# Altium footprint library Hydra_Ref_pcb.PcbLib: 353 footprints (part 1 of 23)
Each footprint in its own frame and in the unit in brackets; x right, y up, seen from the top. Pads: shape width x height; smd on the part's side, far side on the other; paste and mask are expansions set on the pad; w line width, h text height; cw(c..) or ccw(c..) is an arc to the next point about the centre after c.
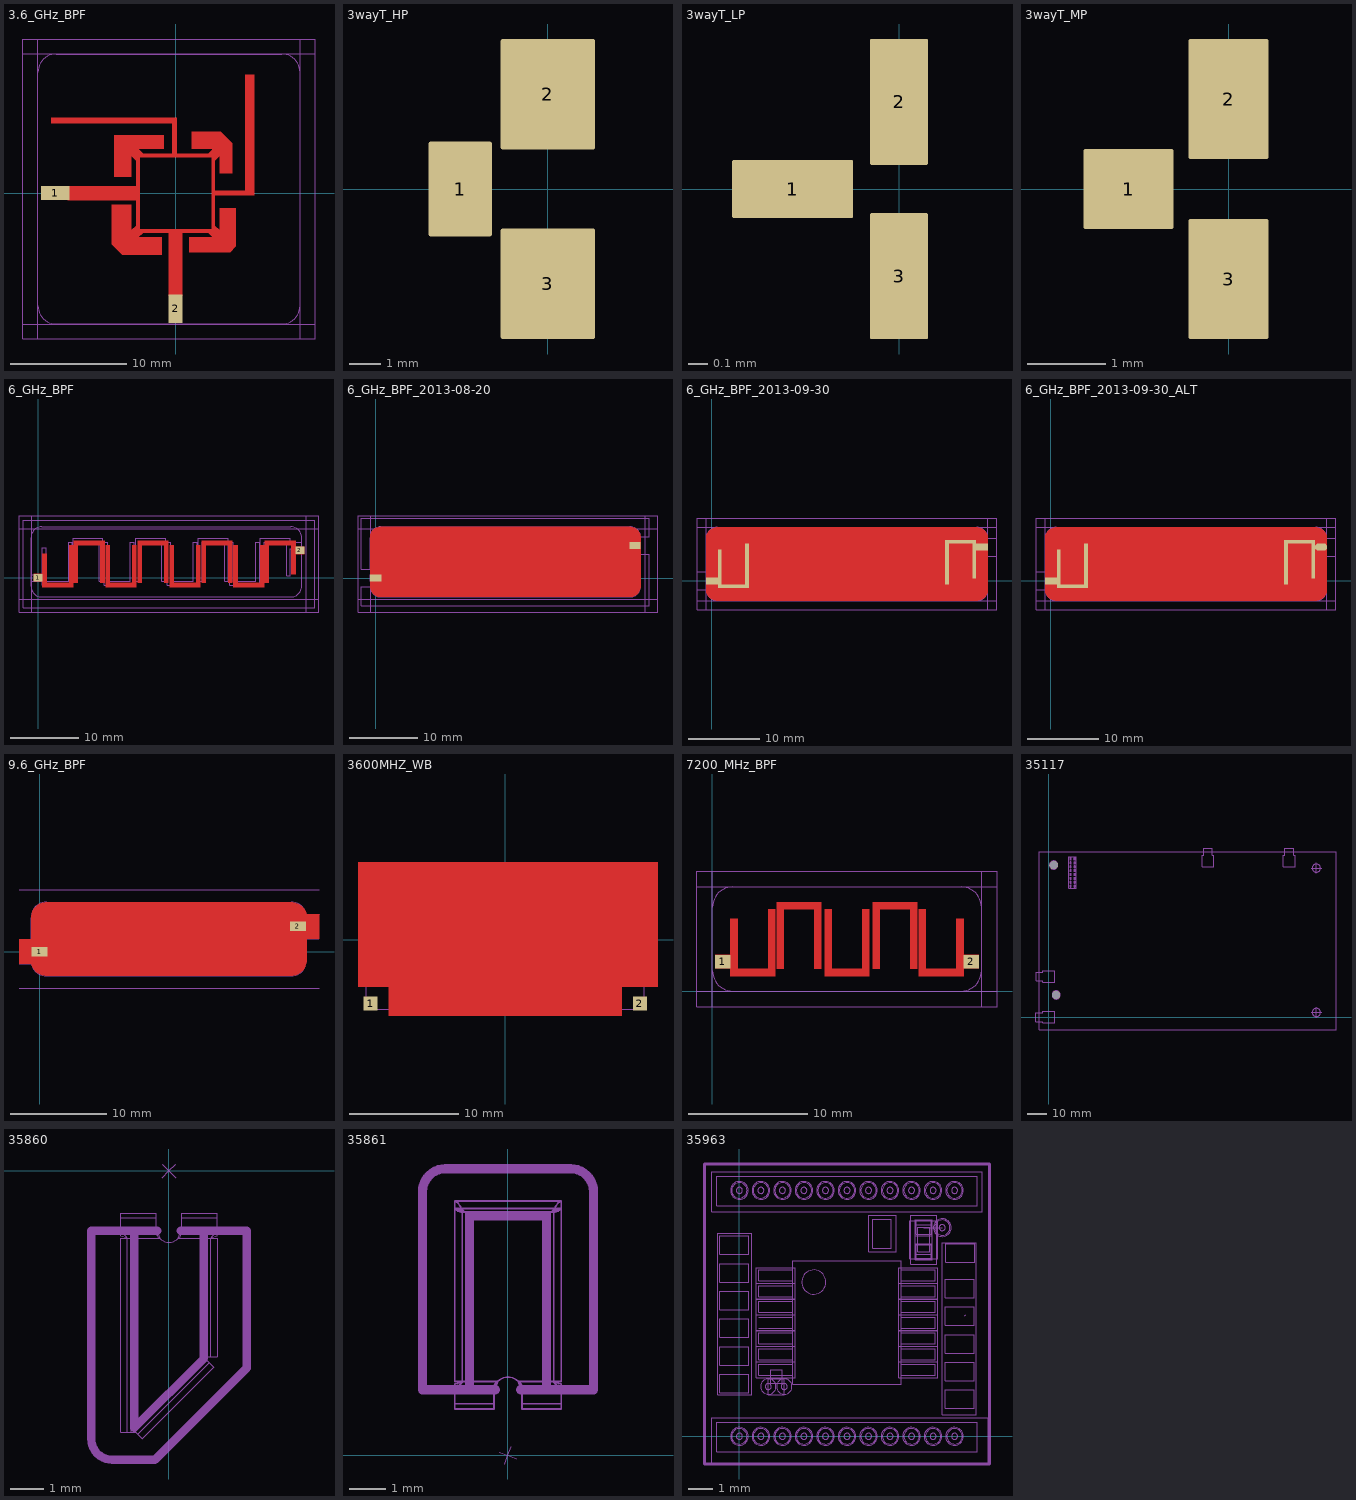
[diagram p0: the footprints below, top view; thin cyan lines are the x and y axes]

## 3.6_GHz_BPF [mm]
height 3.81
pads (2):
  rect 2.47x1.2 smd paste-1.27 mask+0: 1(-10.365,0)
  rect 1.2x2.47 smd paste-1.27 mask+0: 2(0,-9.965)
Top Layer:
  region: -5.5,-4.4 -4.6,-5.3 -1.2,-5.3 -1.2,-3.8 -3.2,-3.8 -2.8,-3.4 -0.6,-3.4 -0.6,-8.865 0.6,-8.865 0.6,-3.4 2.8,-3.4 3.2,-3.8 1.2,-3.8 1.2,-5.1 4.7,-5.1 5.2,-4.6 5.2,-1.3 3.8,-1.3 3.8,-3.2 3.4,-2.8 3.4,-0.2 6.8,-0.2 6.8,10.2 6,10.2 6,0.2 3.4,0.2 3.4,2.8 3.8,3.2 3.8,1.7 4.9,1.7 4.9,4.3 3.9,5.3 1.4,5.3 1.4,3.8 3.2,3.8 3.1,3.7 2.8,3.4 0.465,3.4 0.465,3.1 3.1,3.1 3.1,-3.1 -3.1,-3.1 -3.1,3.1 0.465,3.1 0.465,3.4 0.1,3.4 0.1,6.5 -10.7,6.5 -10.7,6 -0.3,6 -0.3,3.4 -2.8,3.4 -3.2,3.8 -1,3.8 -1,5 -5.3,5 -5.3,1.4 -3.8,1.4 -3.8,3.2 -3.4,2.8 -3.4,0.6 -9.271,0.6 -9.271,-0.6 -3.4,-0.6 -3.4,-2.8 -3.8,-3.2 -3.8,-1 -5.5,-1
Top Solder:
  rectangle: -11.875,-11.303 10.75,12
9 Top Assy:
  lines w0.051: -11.85,-9.703 ccw(c-10.275,-9.703) -10.275,-11.278 9.15,-11.278 ccw(c9.15,-9.703) 10.725,-9.703 10.725,10.4 ccw(c9.15,10.4) 9.15,11.975 -10.275,11.975 ccw(c-10.275,10.4) -11.85,10.4 -11.85,-9.703
13 Top 3D Bodies:
  lines w0.051: -13.145,-11.303 -11.875,-11.303 ; -13.145,12 -11.875,12 ; -11.875,-12.573 -11.875,-11.303 ; -11.875,-11.475 -11.875,12 ; 10.75,-12.573 10.75,-11.303 ; 10.75,13.27 10.75,12 ; 12.02,-11.303 10.75,-11.303 ; 12.02,12 10.75,12 ; -11.875,-11.303 10.75,-11.303 ; -11.875,12 10.75,12 ; -11.875,12 -11.875,13.27 ; -11.875,13.27 -13.145,13.27 -13.145,-12.573 12.02,-12.573 12.02,13.27 -11.875,13.27 ; 10.75,-11.303 10.75,12
Mechanical 30:
  lines w0.051: -13.145,-11.303 -11.875,-11.303 ; -13.145,12 -11.875,12 ; -11.875,-12.573 -11.875,-11.303 ; -11.875,-11.475 -11.875,12 ; 10.75,-12.573 10.75,-11.303 ; 10.75,13.27 10.75,12 ; 12.02,-11.303 10.75,-11.303 ; 12.02,12 10.75,12 ; -11.875,-11.303 10.75,-11.303 ; -11.875,12 10.75,12 ; -11.875,12 -11.875,13.27 ; -11.875,13.27 12.02,13.27 12.02,-12.573 -13.145,-12.573 -13.145,13.27 -11.875,13.27 ; 10.75,-11.303 10.75,12
3D body: height 3.78, standoff 0, extent -11.85,-11.278 10.725,11.975

## 3wayT_HP [mil] "3 way high power power net tie T shape junction"
height 1
pads (3):
  rrect5% 80x120 smd paste-100 mask-100: 1(-111,0)
  rrect5% 120x140 smd paste-100 mask-100: 2(0,120) 3(0,-120)

## 3wayT_LP [mil] "3 way low power net tie T shape junction"
height 1
pads (3):
  rrect5% 25x12 smd paste-100 mask-15: 1(-22,0)
  rrect5% 12x26 smd paste-100 mask-15: 2(0,18) 3(0,-18)

## 3wayT_MP [mil] "3 way medium power net tie T shape junction"
height 1
pads (3):
  rrect5% 45x40 smd paste-100 mask-100: 1(-50,0)
  rrect5% 40x60 smd paste-100 mask-100: 2(0,45) 3(0,-45)

## 6_GHz_BPF [mil]
height 180
pads (2):
  rect 50x44 smd paste-25 mask+10: 1(0,0) 2(1513.25,158)
Top Layer:
  region: 1310.25,-30 1310.25,212 1488.25,212 1488.25,180 1538.25,180 1538.25,136 1488.25,136 1488.25,21 1464.25,21 1464.25,188 1334.25,188 1334.25,-30
  region: 1129.25,-54 1129.25,188 1153.25,188 1153.25,-30 1283.25,-30 1283.25,188 1307.25,188 1307.25,-54
  region: 944.75,-30 944.75,212 1122.75,212 1122.75,-30 1098.75,-30 1098.75,188 968.75,188 968.75,-30
  region: 760,-54 760,188 784,188 784,-30 914,-30 914,188 938,188 938,-54
  region: 575.25,-30 575.25,212 753.25,212 753.25,-30 729.25,-30 729.25,188 599.25,188 599.25,-30
  region: 390.5,-54 390.5,188 414.5,188 414.5,-30 544.5,-30 544.5,188 568.5,188 568.5,-54
  region: 206,-30 206,212 384,212 384,-30 360,-30 360,188 230,188 230,-30
  region: -25,-22 -25,22 25,22 25,137 49,137 49,-30 179,-30 179,188 203,188 203,-54 25,-54 25,-22
Top Solder:
  rectangle: -35,-124 1548.25,282
7 DXF/DWG Import:
  lines w2: -40.25,-22 25,-22 25,-43.5 198,-43.5 198,205 176.5,205 176.5,-22 46.5,-22 46.5,172.5 25,172.5 25,17 -40.25,17 ; -40.25,-49 ccw(c22.25,-49) 22.25,-111.5 1460.5,-111.5 ccw(c1460.5,-49) 1523,-49 1523,232 ccw(c1460.5,232) 1460.5,294.5 22.25,294.5 ccw(c22.25,232) -40.25,232 -40.25,-49 ; 202,-22 223.5,-22 223.5,205 353.5,205 353.5,-22 375,-22 375,226.5 202,226.5 202,-22 ; 382.5,-43.5 382.5,205 404,205 404,-22 534,-22 534,205 555.5,205 555.5,-43.5 382.5,-43.5 ; 564,-22 585.5,-22 585.5,205 715.5,205 715.5,-22 737,-22 737,226.5 564,226.5 564,-22 ; 745.5,-43.5 745.5,205 767,205 767,-22 897,-22 897,205 918.5,205 918.5,-43.5 745.5,-43.5 ; 927,-22 948.5,-22 948.5,205 1078.5,205 1078.5,-22 1100,-22 1100,226.5 927,226.5 927,-22 ; 1107.5,-43.5 1107.5,205 1129,205 1129,-22 1259,-22 1259,205 1280.5,205 1280.5,-43.5 1107.5,-43.5 ; 1284.5,-22 1306,-22 1306,205 1436,205 1436,10.5 1457.5,10.5 1457.5,166 1523,166 1523,205 1457.5,205 1457.5,226.5 1284.5,226.5 1284.5,-22
9 Top Assy:
  lines w2: -110,-124 -35,-124 -35,-199 ; -110,282 -35,282 -35,357 ; 1548.25,-199 1548.25,-124 1623.25,-124 ; 1548.25,357 1548.25,282 1623.25,282 ; -35,357 -110,357 -110,-199 1623.25,-199 1623.25,357 -35,357
  lines w3: -35,-124 1548.25,-124 1548.25,282 -35,282 -35,-124
  text ".Designator" at 631,54 h50
13 Top 3D Bodies:
  lines w2: -85,-124 -35,-124 -35,-174 ; -85,282 -35,282 -35,332 ; 1548.25,-174 1548.25,-124 1598.25,-124 ; 1548.25,332 1548.25,282 1598.25,282 ; -35,332 1598.25,332 1598.25,-174 -85,-174 -85,332 -35,332
  lines w3: -35,-124 -35,282 1548.25,282 1548.25,-124 -35,-124
3D body: height 180, standoff 0, extent -85,-174 1598.25,332

## 6_GHz_BPF_2013-08-20 [mil]
height 180
pads (2):
  rect 65.25x39 smd paste-25 mask+10: 1(0,0)
  rect 65.5x39 smd paste-25 mask+10: 2(1497.88,188)
Top Layer:
  region: 1292.12,-19.5 1292.12,229 1465.12,229 1465.12,207.5 1530.62,207.5 1530.62,168.5 1465.12,168.5 1465.12,13 1443.62,13 1443.62,207.5 1313.62,207.5 1313.62,-19.5
  region: 1115.12,-41 1115.12,207.5 1136.62,207.5 1136.62,-19.5 1266.62,-19.5 1266.62,207.5 1288.12,207.5 1288.12,-41
  region: 934.62,-19.5 934.62,229 1107.62,229 1107.62,-19.5 1086.12,-19.5 1086.12,207.5 956.12,207.5 956.12,-19.5
  region: 753.12,-41 753.12,207.5 774.62,207.5 774.62,-19.5 904.62,-19.5 904.62,207.5 926.12,207.5 926.12,-41
  region: 571.62,-19.5 571.62,229 744.62,229 744.62,-19.5 723.12,-19.5 723.12,207.5 593.12,207.5 593.12,-19.5
  region: 390.12,-41 390.12,207.5 411.62,207.5 411.62,-19.5 541.62,-19.5 541.62,207.5 563.12,207.5 563.12,-41
  region: 209.62,-19.5 209.62,229 382.62,229 382.62,-19.5 361.12,-19.5 361.12,207.5 231.12,207.5 231.12,-19.5
  region: -32.62,-19.5 -32.62,19.5 32.62,19.5 32.62,175 54.12,175 54.12,-19.5 184.12,-19.5 184.12,207.5 205.62,207.5 205.62,-41 32.62,-41 32.62,-19.5
  pour cut-out: -32.62,234.5 -32.62,240.66 -30.22,252.73 -25.51,264.1 -18.67,274.34 -9.97,283.05 0.27,289.89 11.64,294.6 23.72,297 29.88,297 1468.12,297 1474.28,297 1486.36,294.6 1497.73,289.89 1507.97,283.05 1516.67,274.34 1523.51,264.1 1528.22,252.73 1530.62,240.66 1530.62,234.5 1530.62,-46.5 1530.62,-52.66 1528.22,-64.73 1523.51,-76.1 1516.67,-86.34 1507.97,-95.05 1497.73,-101.89 1486.36,-106.6 1474.28,-109 1468.12,-109 29.87,-109 23.94,-109 12.29,-106.77 1.26,-102.38 -8.74,-96 -17.36,-87.85 -24.3,-78.23 -29.3,-67.47 -32.19,-55.96 -32.52,-50.04 -32.55,-49.59 -32.59,-48.71 -32.61,-47.83 -32.62,-46.94 -32.62,-46.5
Top Solder:
  region: -32.62,234.5 -32.62,240.66 -30.22,252.73 -25.51,264.1 -18.67,274.34 -9.97,283.05 0.27,289.89 11.64,294.6 23.72,297 29.88,297 1468.12,297 1474.28,297 1486.36,294.6 1497.73,289.89 1507.97,283.05 1516.67,274.34 1523.51,264.1 1528.22,252.73 1530.62,240.66 1530.62,234.5 1530.62,-46.5 1530.62,-52.66 1528.22,-64.73 1523.51,-76.1 1516.67,-86.34 1507.97,-95.05 1497.73,-101.89 1486.36,-106.6 1474.28,-109 1468.12,-109 29.87,-109 23.94,-109 12.29,-106.77 1.26,-102.38 -8.74,-96 -17.36,-87.85 -24.3,-78.23 -29.3,-67.47 -32.19,-55.96 -32.52,-50.04 -32.55,-49.59 -32.59,-48.71 -32.61,-47.83 -32.62,-46.94 -32.62,-46.5
9 Top Assy:
  lines w2: -102.38,-121.5 -27.38,-121.5 -27.38,-196.5 ; -102.38,284.5 -27.38,284.5 -27.38,359.5 ; 1555.88,-196.5 1555.88,-121.5 1630.88,-121.5 ; 1555.88,359.5 1555.88,284.5 1630.88,284.5 ; -27.38,359.5 -102.38,359.5 -102.38,-196.5 1630.88,-196.5 1630.88,359.5 -27.38,359.5
  lines w3: -27.38,-121.5 1555.88,-121.5 1555.88,284.5 -27.38,284.5 -27.38,-121.5
  text ".Designator" at 562,64 h50
Mechanical 30:
  lines w2: -32.53,-50 -82.62,-50 -82.62,-159 1580.62,-159 ; -32.52,-50.04 ccw(c29.88,-46.5) 29.87,-109 ; 29.88,-109 1468.12,-109 ccw(c1468.12,-46.5) 1530.62,-46.5 1530.62,137.96 ; 1530.63,138 1580.62,138 1580.62,-158.75 ; -82.62,50 -82.62,347 1580.62,347 1580.62,238 1530.53,238 ccw(c1468.12,234.5) 1468.12,297 29.88,297 ccw(c29.88,234.5) -32.62,234.5 -32.62,50 -82.62,50 ; -32.62,-19.5 -32.62,19.5 32.62,19.5 32.62,175 54.12,175 54.12,-19.5 184.12,-19.5 184.12,207.5 205.62,207.5 205.62,-41 32.62,-41 32.62,-19.5 -32.62,-19.5 ; 209.62,-19.5 231.12,-19.5 231.12,207.5 361.12,207.5 361.12,-19.5 382.62,-19.5 382.62,229 209.62,229 209.62,-19.5 ; 390.12,-41 390.12,207.5 411.62,207.5 411.62,-19.5 541.62,-19.5 541.62,207.5 563.12,207.5 563.12,-41 390.12,-41 ; 571.62,-19.5 593.12,-19.5 593.12,207.5 723.12,207.5 723.12,-19.5 744.62,-19.5 744.62,229 571.62,229 571.62,-19.5 ; 753.12,-41 753.12,207.5 774.62,207.5 774.62,-19.5 904.62,-19.5 904.62,207.5 926.12,207.5 926.12,-41 753.12,-41 ; 934.62,-19.5 956.12,-19.5 956.12,207.5 1086.12,207.5 1086.12,-19.5 1107.62,-19.5 1107.62,229 934.62,229 934.62,-19.5 ; 1115.12,-41 1115.12,207.5 1136.62,207.5 1136.62,-19.5 1266.62,-19.5 1266.62,207.5 1288.12,207.5 1288.12,-41 1115.12,-41 ; 1292.12,-19.5 1313.62,-19.5 1313.62,207.5 1443.62,207.5 1443.62,13 1465.12,13 1465.12,168.5 1530.62,168.5 1530.62,207.5 1465.12,207.5 1465.12,229 1292.12,229 1292.12,-19.5
3D body: height 180, standoff 0, extent -82.62,-159 1580.62,347

## 6_GHz_BPF_2013-09-30 [mil]
height 180
pads (8):
  rect 65.25x39 smd paste-25 mask+10: 1(0,0.7)
  rect 21.5x213.5 smd paste-25 mask+10: 1(43.38,66.45) 2(1454.38,120.95)
  rect 130x21.5 smd paste-25 mask+10: 1(119.12,-29.55) 2(1378.62,216.95)
  rect 21.5x246.5 smd paste-25 mask+10: 1(194.88,82.95) 2(1302.88,104.45)
  rect 65.5x39 smd paste-25 mask+10: 2(1497.88,186.7)
Top Layer:
  region: 209.62,-18.8 209.62,227.7 382.62,227.7 382.62,-18.8 361.12,-18.8 361.12,206.2 231.12,206.2 231.12,-18.8
  region: 390.12,-40.3 390.12,206.2 411.62,206.2 411.62,-18.8 541.62,-18.8 541.62,206.2 563.12,206.2 563.12,-40.3
  region: 571.62,-18.8 571.62,227.7 744.62,227.7 744.62,-18.8 723.12,-18.8 723.12,206.2 593.12,206.2 593.12,-18.8
  region: 753.12,-40.3 753.12,206.2 774.62,206.2 774.62,-18.8 904.62,-18.8 904.62,206.2 926.12,206.2 926.12,-40.3
  region: 934.62,-18.8 934.62,227.7 1107.62,227.7 1107.62,-18.8 1086.12,-18.8 1086.12,206.2 956.12,206.2 956.12,-18.8
  region: 1115.12,-40.3 1115.12,206.2 1136.62,206.2 1136.62,-18.8 1266.62,-18.8 1266.62,206.2 1288.12,206.2 1288.12,-40.3
  pour cut-out: -32.62,-46.8 -32.62,234.2 -32.62,240.35 -30.22,252.43 -25.51,263.8 -18.67,274.04 -9.97,282.74 0.27,289.58 11.64,294.3 23.72,296.7 29.88,296.7 1468.12,296.7 1474.28,296.7 1486.36,294.3 1497.73,289.58 1507.97,282.74 1516.67,274.04 1523.51,263.8 1528.22,252.43 1530.62,240.35 1530.62,234.2 1530.62,-46.8 1530.62,-52.96 1528.22,-65.03 1523.51,-76.41 1516.67,-86.64 1507.97,-95.35 1497.73,-102.19 1486.36,-106.9 1474.28,-109.3 1468.12,-109.3 29.87,-109.3 23.72,-109.3 11.64,-106.9 0.27,-102.19 -9.97,-95.35 -18.67,-86.64 -25.51,-76.41 -30.22,-65.03 -32.62,-52.96
Top Solder:
  region: -32.62,-46.8 -32.62,234.2 -32.62,240.35 -30.22,252.43 -25.51,263.8 -18.67,274.04 -9.97,282.74 0.27,289.58 11.64,294.3 23.72,296.7 29.88,296.7 1468.12,296.7 1474.28,296.7 1486.36,294.3 1497.73,289.58 1507.97,282.74 1516.67,274.04 1523.51,263.8 1528.22,252.43 1530.62,240.35 1530.62,234.2 1530.62,-46.8 1530.62,-52.96 1528.22,-65.03 1523.51,-76.41 1516.67,-86.64 1507.97,-95.35 1497.73,-102.19 1486.36,-106.9 1474.28,-109.3 1468.12,-109.3 29.87,-109.3 23.72,-109.3 11.64,-106.9 0.27,-102.19 -9.97,-95.35 -18.67,-86.64 -25.51,-76.41 -30.22,-65.03 -32.62,-52.96
9 Top Assy:
  lines w2: 32.37,-108.3 cw(c32.38,-44.3) -31.62,-44.3 -31.62,231.7 cw(c32.38,231.7) 32.38,295.7 1465.58,295.7 cw(c1465.58,231.7) 1529.58,231.7 1529.58,-44.3 cw(c1465.58,-44.3) 1465.58,-108.3 32.38,-108.3
Mechanical 30:
  lines w2: -82.62,-109.3 1580.5,-109.3 ; -82.62,-49.3 -32.58,-49.3 ; -82.62,50.7 -32.62,50.7 -32.62,234.2 cw(c29.88,234.2) 29.88,296.7 1468.12,296.7 cw(c1468.12,234.2) 1530.57,236.7 ; -82.62,296.7 1580.62,296.7 ; -32.62,-159.3 -32.62,346.7 ; -32.57,-49.3 ccw(c29.88,-46.8) 29.87,-109.3 ; 29.88,-109.3 1468.12,-109.3 ccw(c1468.12,-46.8) 1530.62,-46.8 1530.62,136.7 1580.62,136.7 ; 1530.58,-159.3 1530.58,346.7 ; 1530.58,236.7 1580.62,236.7 ; 1580.5,-159.3 -82.62,-159.3 -82.62,346.7 1580.62,346.7 1580.62,-159.3 ; -32.62,-18.8 32.62,-18.8 32.62,-40.3 205.62,-40.3 205.62,206.2 184.12,206.2 184.12,-18.8 54.12,-18.8 54.12,173.2 32.62,173.2 32.62,20.2 -32.62,20.2 -32.62,-18.8 ; 209.62,-18.8 231.12,-18.8 231.12,206.2 361.12,206.2 361.12,-18.8 382.62,-18.8 382.62,227.7 209.62,227.7 209.62,-18.8 ; 390.12,-40.3 390.12,206.2 411.62,206.2 411.62,-18.8 541.62,-18.8 541.62,206.2 563.12,206.2 563.12,-40.3 390.12,-40.3 ; 571.62,-18.8 593.12,-18.8 593.12,206.2 723.12,206.2 723.12,-18.8 744.62,-18.8 744.62,227.7 571.62,227.7 571.62,-18.8 ; 753.12,-40.3 753.12,206.2 774.62,206.2 774.62,-18.8 904.62,-18.8 904.62,206.2 926.12,206.2 926.12,-40.3 753.12,-40.3 ; 934.62,-18.8 956.12,-18.8 956.12,206.2 1086.12,206.2 1086.12,-18.8 1107.62,-18.8 1107.62,227.7 934.62,227.7 934.62,-18.8 ; 1115.12,-40.3 1115.12,206.2 1136.62,206.2 1136.62,-18.8 1266.62,-18.8 1266.62,206.2 1288.12,206.2 1288.12,-40.3 1115.12,-40.3 ; 1292.12,-18.8 1313.62,-18.8 1313.62,206.2 1443.62,206.2 1443.62,14.2 1465.12,14.2 1465.12,167.2 1530.62,167.2 1530.62,206.2 1465.12,206.2 1465.12,227.7 1292.12,227.7 1292.12,-18.8
3D body: height 149, standoff 0, extent -31.62,-108.3 1529.58,295.7

## 6_GHz_BPF_2013-09-30_ALT [mil]
height 180
pads (8):
  rect 65.25x39 smd paste-25 mask+10: 1(0,0.7)
  rect 21.5x213.5 smd paste-25 mask+10: 1(43.38,66.45) 2(1454.38,120.95)
  rect 130x21.5 smd paste-25 mask+10: 1(119.12,-29.55) 2(1378.62,216.95)
  rect 21.5x246.5 smd paste-25 mask+10: 1(194.88,82.95) 2(1302.88,104.45)
  oct 65.5x39 smd paste-25 mask+10: 2(1497.88,186.7)
Top Layer:
  rectangle: 1453.5,167.2 1478.4,206.2
  pour cut-out: -32.62,-46.8 -32.62,234.2 -32.62,240.35 -30.22,252.43 -25.51,263.8 -18.67,274.04 -9.97,282.74 0.27,289.58 11.64,294.3 23.72,296.7 29.88,296.7 1468.12,296.7 1474.28,296.7 1486.36,294.3 1497.73,289.58 1507.97,282.74 1516.67,274.04 1523.51,263.8 1528.22,252.43 1530.62,240.35 1530.62,234.2 1530.62,-46.8 1530.62,-52.96 1528.22,-65.03 1523.51,-76.41 1516.67,-86.64 1507.97,-95.35 1497.73,-102.19 1486.36,-106.9 1474.28,-109.3 1468.12,-109.3 29.87,-109.3 23.72,-109.3 11.64,-106.9 0.27,-102.19 -9.97,-95.35 -18.67,-86.64 -25.51,-76.41 -30.22,-65.03 -32.62,-52.96
  region: 1115.12,-40.3 1115.12,206.2 1136.62,206.2 1136.62,-18.8 1266.62,-18.8 1266.62,206.2 1288.12,206.2 1288.12,-40.3
  region: 934.62,-18.8 934.62,227.7 1107.62,227.7 1107.62,-18.8 1086.12,-18.8 1086.12,206.2 956.12,206.2 956.12,-18.8
  region: 753.12,-40.3 753.12,206.2 774.62,206.2 774.62,-18.8 904.62,-18.8 904.62,206.2 926.12,206.2 926.12,-40.3
  region: 571.62,-18.8 571.62,227.7 744.62,227.7 744.62,-18.8 723.12,-18.8 723.12,206.2 593.12,206.2 593.12,-18.8
  region: 390.12,-40.3 390.12,206.2 411.62,206.2 411.62,-18.8 541.62,-18.8 541.62,206.2 563.12,206.2 563.12,-40.3
  region: 209.62,-18.8 209.62,227.7 382.62,227.7 382.62,-18.8 361.12,-18.8 361.12,206.2 231.12,206.2 231.12,-18.8
Top Solder:
  region: -32.62,-46.8 -32.62,234.2 -32.62,240.35 -30.22,252.43 -25.51,263.8 -18.67,274.04 -9.97,282.74 0.27,289.58 11.64,294.3 23.72,296.7 29.88,296.7 1468.12,296.7 1474.28,296.7 1486.36,294.3 1497.73,289.58 1507.97,282.74 1516.67,274.04 1523.51,263.8 1528.22,252.43 1530.62,240.35 1530.62,234.2 1530.62,-46.8 1530.62,-52.96 1528.22,-65.03 1523.51,-76.41 1516.67,-86.64 1507.97,-95.35 1497.73,-102.19 1486.36,-106.9 1474.28,-109.3 1468.12,-109.3 29.87,-109.3 23.72,-109.3 11.64,-106.9 0.27,-102.19 -9.97,-95.35 -18.67,-86.64 -25.51,-76.41 -30.22,-65.03 -32.62,-52.96
9 Top Assy:
  lines w2: 32.37,-108.3 cw(c32.38,-44.3) -31.62,-44.3 -31.62,231.7 cw(c32.38,231.7) 32.38,295.7 1465.58,295.7 cw(c1465.58,231.7) 1529.58,231.7 1529.58,-44.3 cw(c1465.58,-44.3) 1465.58,-108.3 32.38,-108.3
Mechanical 30:
  lines w2: -82.62,-109.3 1580.5,-109.3 ; -82.62,-49.3 -32.58,-49.3 ; -82.62,50.7 -32.62,50.7 -32.62,234.2 cw(c29.88,234.2) 29.88,296.7 1468.12,296.7 cw(c1468.12,234.2) 1530.57,236.7 ; -82.62,296.7 1580.62,296.7 ; -32.62,-159.3 -32.62,346.7 ; -32.57,-49.3 ccw(c29.88,-46.8) 29.87,-109.3 ; 29.88,-109.3 1468.12,-109.3 ccw(c1468.12,-46.8) 1530.62,-46.8 1530.62,136.7 1580.62,136.7 ; 1530.58,-159.3 1530.58,346.7 ; 1530.58,236.7 1580.62,236.7 ; 1580.5,-159.3 -82.62,-159.3 -82.62,346.7 1580.62,346.7 1580.62,-159.3 ; -32.62,-18.8 -32.62,20.2 32.62,20.2 32.62,173.2 54.12,173.2 54.12,-18.8 184.12,-18.8 184.12,206.2 205.62,206.2 205.62,-40.3 32.62,-40.3 32.62,-18.8 -32.62,-18.8 ; 209.62,-18.8 209.62,227.7 382.62,227.7 382.62,-18.8 361.12,-18.8 361.12,206.2 231.12,206.2 231.12,-18.8 209.62,-18.8 ; 390.12,-40.3 563.12,-40.3 563.12,206.2 541.62,206.2 541.62,-18.8 411.62,-18.8 411.62,206.2 390.12,206.2 390.12,-40.3 ; 571.62,-18.8 571.62,227.7 744.62,227.7 744.62,-18.8 723.12,-18.8 723.12,206.2 593.12,206.2 593.12,-18.8 571.62,-18.8 ; 753.12,-40.3 926.12,-40.3 926.12,206.2 904.62,206.2 904.62,-18.8 774.62,-18.8 774.62,206.2 753.12,206.2 753.12,-40.3 ; 934.62,-18.8 934.62,227.7 1107.62,227.7 1107.62,-18.8 1086.12,-18.8 1086.12,206.2 956.12,206.2 956.12,-18.8 934.62,-18.8 ; 1115.12,-40.3 1288.12,-40.3 1288.12,206.2 1266.62,206.2 1266.62,-18.8 1136.62,-18.8 1136.62,206.2 1115.12,206.2 1115.12,-40.3 ; 1292.12,-18.8 1292.12,227.7 1465.12,227.7 1465.12,206.2 1530.62,206.2 1530.62,167.2 1465.12,167.2 1465.12,14.2 1443.62,14.2 1443.62,206.2 1313.62,206.2 1313.62,-18.8 1292.12,-18.8
3D body: height 149, standoff 0, extent -31.62,-108.3 1529.58,295.7

## 9.6_GHz_BPF [mil]
height 150
pads (2):
  rect 65.25x39 smd paste-25 mask+10: 1(0,0) 2(1052.75,103)
Top Layer:
  region: 914.88,-19.5 914.88,144 1022.88,144 1022.88,122.5 1085.38,122.5 1085.38,83.5 1022.88,83.5 1022.88,-3 1001.38,-3 1001.38,122.5 936.38,122.5 936.38,-19.5
  region: 798.38,-41 798.38,122.5 819.88,122.5 819.88,-19.5 884.88,-19.5 884.88,122.5 906.38,122.5 906.38,-41
  region: 670.88,-19.5 670.88,144 778.88,144 778.88,-19.5 757.38,-19.5 757.38,122.5 692.38,122.5 692.38,-19.5
  region: 538.88,-41 538.88,122.5 560.38,122.5 560.38,-19.5 625.38,-19.5 625.38,122.5 646.88,122.5 646.88,-41
  region: 405.88,-19.5 405.88,144 513.88,144 513.88,-19.5 492.38,-19.5 492.38,122.5 427.38,122.5 427.38,-19.5
  region: 273.88,-41 273.88,122.5 295.38,122.5 295.38,-19.5 360.38,-19.5 360.38,122.5 381.88,122.5 381.88,-41
  region: 146.38,-19.5 146.38,144 254.38,144 254.38,-19.5 232.88,-19.5 232.88,122.5 167.88,122.5 167.88,-19.5
  region: -32.62,-19.5 -32.62,19.5 29.88,19.5 29.88,106 51.38,106 51.38,-19.5 116.38,-19.5 116.38,122.5 137.88,122.5 137.88,-41 29.88,-41 29.88,-19.5
  pour cut-out: -84.62,-50 -34.04,-50 -32.86,-55.13 -28.81,-64.86 -23.2,-73.77 -16.17,-81.61 -7.94,-88.17 1.28,-93.26 11.23,-96.74 21.61,-98.5 26.88,-98.5 1025.88,-98.5 1032.03,-98.5 1044.11,-96.1 1055.48,-91.39 1065.72,-84.55 1074.42,-75.84 1081.26,-65.6 1085.97,-54.23 1088.38,-42.16 1088.38,-36 1088.38,53 1139.38,53 1139.38,153 1087.79,153 1086.61,158.13 1082.57,167.86 1076.95,176.77 1069.93,184.61 1061.69,191.17 1052.47,196.26 1042.53,199.74 1032.14,201.5 1026.88,201.5 27.88,201.5 21.72,201.5 9.65,199.1 -1.73,194.39 -11.97,187.55 -20.67,178.84 -27.51,168.6 -32.22,157.23 -34.62,145.16 -34.62,139 -34.62,50 -84.62,50
Top Solder:
  region: -84.62,-148.5 -84.62,251.5 1139.38,251.5 1139.38,-148.5
15 Top Optical Placement:
  lines w2: -84.62,-148.5 1139.38,-148.5 ; -84.62,251.5 1139.38,251.5
Mechanical 30:
  lines w0.08: -35.62,60.5 -35.62,139 ; -35.62,139 cw(c26.88,139) 26.88,201.5 1025.88,201.5 cw(c1025.88,139) 1088.38,139 1088.38,-36 cw(c1025.88,-36) 1025.88,-98.5 26.88,-98.5 cw(c26.88,-36) -35.62,-36 -35.62,139 ; -32.62,-19.5 29.88,-19.5 29.88,-41 137.88,-41 137.88,122.5 116.38,122.5 116.38,-19.5 51.38,-19.5 51.38,106 29.88,106 29.88,19.5 -32.62,19.5 -32.62,-19.5 ; 146.38,-19.5 167.88,-19.5 167.88,122.5 232.88,122.5 232.88,-19.5 254.38,-19.5 254.38,144 146.38,144 146.38,-19.5 ; 273.88,-41 273.88,122.5 295.38,122.5 295.38,-19.5 360.38,-19.5 360.38,122.5 381.88,122.5 381.88,-41 273.88,-41 ; 405.88,-19.5 427.38,-19.5 427.38,122.5 492.38,122.5 492.38,-19.5 513.88,-19.5 513.88,144 405.88,144 405.88,-19.5 ; 538.88,-41 538.88,122.5 560.38,122.5 560.38,-19.5 625.38,-19.5 625.38,122.5 646.88,122.5 646.88,-41 538.88,-41 ; 670.88,-19.5 692.38,-19.5 692.38,122.5 757.38,122.5 757.38,-19.5 778.88,-19.5 778.88,144 670.88,144 670.88,-19.5 ; 798.38,-41 798.38,122.5 819.88,122.5 819.88,-19.5 884.88,-19.5 884.88,122.5 906.38,122.5 906.38,-41 798.38,-41 ; 914.88,-19.5 936.38,-19.5 936.38,122.5 1001.38,122.5 1001.38,-3 1022.88,-3 1022.88,83.5 1085.38,83.5 1085.38,122.5 1022.88,122.5 1022.88,144 914.88,144 914.88,-19.5
Mechanical 32:
  lines w2: -84.62,-50 -34.04,-50 ccw(c26.88,-36) 26.88,-98.5 1025.88,-98.5 ccw(c1025.88,-36) 1088.38,-36 1088.38,53 1138.38,53 ; -84.62,50 -34.62,50 -34.62,139 cw(c27.88,139) 27.88,201.5 1026.88,201.5 cw(c1026.88,139) 1087.79,153 1139.38,153
3D body: height 150, standoff 0, extent -84.62,-148.5 1139.38,251.5

## 3600MHZ_WB [mil] "Lark part # MS816-557"
height 240
pads (2):
  rect 50x50 smd: 1(-485,-230) 2(485,-230)
Top Layer:
  rectangle: -530,-170 550,280
  rectangle: -420,-275 420,-155
9 Top Assy:
  lines w2: -500,-250 500,-250 500,250 -500,250 -500,-250
  text ".Designator" at -124,-17 h50
15 Top Optical Placement:
  text ".Designator" at -175,-35 h80

## 7200_MHz_BPF [mil]
height 150
pads (2):
  rect 50x44 smd paste-25 mask+10: 1(35,97) 2(853,97)
Top Layer:
  region: 10,75 10,119 60,119 60,239 84,239 84,73 184,73 184,269 208,269 208,49 60,49 60,75
  region: 212,73 212,293 360,293 360,73 336,73 336,269 236,269 236,73
  region: 370,49 370,269 394,269 394,73 494,73 494,269 518,269 518,49
  region: 528,73 528,293 676,293 676,73 652,73 652,269 552,269 552,73
  region: 680,49 680,269 704,269 704,73 804,73 804,239 828,239 828,119 878,119 878,75 828,75 828,49
Top Solder:
  rectangle: 0,-1 888,344
9 Top Assy:
  lines w3: 1,67 ccw(c68,67) 68,0 820,0 ccw(c820,67) 887,67 887,276 ccw(c820,276) 820,343 68,343 ccw(c68,276) 1,276 1,67
13 Top 3D Bodies:
  lines w2: -50,-1 0,-1 0,-51 ; -50,344 0,344 0,394 ; 888,-51 888,-1 938,-1 ; 938,344 888,344 888,394 ; 888,394 938,394 938,-51 -50,-51 -50,394 888,394
  lines w3: 0,-1 0,344 888,344 888,-1 0,-1
3D body: height 149, standoff 0, extent 1,0 887,343

## 35117 [mil] "HYDRA A1-A3 BOARD PCA"
height 708
pads (2):
  round 161 hole 166 unplated: MH1(101,3074) MH2(151,448.53)
9 Top Assy:
  circle w2: c5411,3012 r83
  circle w2: c151,448.53 r83
  circle w2: c101,3074 r83
  circle w2: c5411,95 r83
Mechanical 30:
  circle w2: c442.61,3197.59 r17
  circle w2: c442.61,3118.85 r17
  circle w2: c442.61,3040.11 r17
  circle w2: c442.61,2961.37 r17
  circle w2: c442.61,2882.63 r17
  circle w2: c442.61,2803.89 r17
  circle w2: c442.61,2725.15 r17
  circle w2: c442.61,2646.41 r17
  circle w2: c521.35,2646.41 r17
  circle w2: c521.35,2725.15 r17
  circle w2: c521.35,2803.89 r17
  circle w2: c521.35,2882.63 r17
  circle w2: c521.35,2961.37 r17
  circle w2: c521.35,3040.11 r17
  circle w2: c521.35,3118.85 r17
  circle w2: c521.35,3197.59 r17
  circle w2: c5411,3012 r82.73
  circle w2: c5411,95 r82.73
  circle w2: c151,448.53 r82.73
  circle w2: c101,3074 r82.73
  lines w2: 499.25,3197.59 521.35,3197.59 ; 521.35,3175.49 521.35,3197.59 ; 521.35,3219.69 521.35,3197.59 ; 543.45,3197.59 521.35,3197.59 ; 5303.45,95 5411,95 ; 5303.45,3012 5411,3012 ; 5411,-12.55 5411,95 ; 5411,202.55 5411,95 ; 5411,2904.45 5411,3012 ; 5411,3119.55 5411,3012 ; 5518.55,95 5411,95 ; 5518.55,3012 5411,3012 ; -256,-88.32 -118,-88.32 -118,-117.98 117.98,-117.98 117.98,117.98 -117.98,117.98 -117.98,88.33 -256,88.33 -256,-88.32 ; -255,731.68 -255,908.33 -116.98,908.33 -116.98,937.98 118.98,937.98 118.98,702.02 -117,702.02 -117,731.68 -255,731.68 ; -193,-253 -193,3347 5807,3347 5807,-253 -193,-253 ; 404.48,2607.2 559.48,2607.2 559.48,3236.8 404.48,3236.8 404.48,2607.2 ; 3103.2,3037.8 3103.2,3273.78 3132.85,3273.78 3132.85,3411.78 3309.51,3411.78 3309.51,3273.76 3339.16,3273.76 3339.16,3037.8 3103.2,3037.8 ; 4744.14,3037.8 4744.14,3273.78 4773.8,3273.78 4773.8,3411.78 4950.45,3411.78 4950.45,3273.76 4980.1,3273.76 4980.1,3037.8 4744.14,3037.8
  text "J1" at -26,-18 h40
  text "J5" at 451,3266 h40
  text "1" at 585,3181 h40
  text "RF IN 1" at -120,-172 h40
  text "RF IN 2" at -126,639 h40
  text "J2" at -34,799 h40
  text "RF OUT" at 3051,3272 h40
  text "J3" at 3199,3190 h40
  text "LOG DET" at 4688,3287 h40
  text "J4" at 4846,3196 h40
3D body: height 693.3, standoff 517, extent 4773.8,3273.78 4950.45,3411.78
3D body: height 699.8, standoff 486.8, extent 4744.14,3037.8 4980.1,3273.76
3D body: height 693.3, standoff 517, extent 3132.85,3273.78 3309.51,3411.78
3D body: height 699.8, standoff 486.8, extent 3103.2,3037.8 3339.16,3273.76
3D body: height 693.3, standoff 517, extent -255,731.68 -117,908.33
3D body: height 699.8, standoff 486.8, extent -116.98,702.02 118.98,937.98
3D body: height 786.8, standoff 486.8, extent -192.99,-252.99 5807,3347.01
3D body "35118C_STP.step": height 486.8, standoff 408, extent -192.99,-252.99 5807.01,3347
3D body: height 699.8, standoff 486.8, extent -117.98,-117.98 117.98,117.98
3D body: height 693.3, standoff 517, extent -256,-88.32 -118,88.33

## 35129_A3_PCBA_PROXY [mil] "35129_A3_PCBA_PROXY"
3D body: height -624.41, standoff -1062.2, extent 6730.03,3649.36 8968.61,8421.48
3D body: height -878.91, standoff -1371, extent 6741.83,5427.71 6958.37,5644.24
3D body: height -878.91, standoff -1371, extent 8740.26,3678.89 8956.8,3895.43
3D body: height -384.44, standoff -1414.85, extent -339.98,-718.51 11284.61,11968.49

## 35860 [mil] "SHIELD,HYDRA,A1-J18"
height 37
Top Solder:
  pour cut-out: -87.48,-318.85 -87.09,-322.73 -84.1,-329.9 -78.61,-335.39 -71.44,-338.37 -67.56,-338.76 -67.55,-338.76 -67.54,-338.76 -67.52,-338.76 -67.51,-338.76 -67.5,-338.76 -18.86,-338.76 87.48,-232.42 87.49,-76.16 13.89,-76.16 11.81,-76.16 8.88,-73.22 8.88,-69.06 11.81,-66.13 13.89,-66.13 92.5,-66.13 93.5,-66.13 95.34,-66.89 96.75,-68.3 97.52,-70.14 97.52,-71.14 97.51,-234.5 97.51,-235 97.32,-235.97 96.94,-236.89 96.38,-237.71 96.03,-238.06 -13.22,-347.31 -13.57,-347.66 -14.39,-348.22 -15.31,-348.6 -16.28,-348.79 -16.78,-348.79 -67.5,-348.79 -67.49,-348.79 -67.48,-348.79 -67.46,-348.79 -67.44,-348.79 -67.5,-348.79 -70.46,-348.79 -76.26,-347.64 -81.72,-345.38 -86.63,-342.09 -90.81,-337.91 -94.1,-333 -96.36,-327.53 -97.52,-321.74 -97.52,-318.78 -97.52,-318.77 -97.52,-318.75 -97.51,-318.73 -97.51,-318.71 -97.51,-318.7 -97.51,-71.14 -97.51,-70.14 -96.75,-68.3 -95.34,-66.89 -93.5,-66.13 -92.5,-66.13 -13.89,-66.13 -12.89,-66.13 -11.05,-66.89 -9.64,-68.3 -8.88,-70.14 -8.88,-71.14 -8.88,-72.14 -9.64,-73.98 -11.05,-75.39 -12.89,-76.16 -13.89,-76.16 -87.48,-76.16 -87.48,-318.78 -87.48,-318.79 -87.48,-318.81 -87.48,-318.82 -87.48,-318.84
  pour cut-out: -46.52,-306 -46.52,-307.52 -44.82,-310.06 -42,-311.22 -39.01,-310.61 -37.94,-309.53 45.03,-226.56 45.38,-226.21 45.94,-225.39 46.32,-224.47 46.52,-223.5 46.52,-223 46.52,-71.14 46.52,-69.07 43.58,-66.13 39.42,-66.13 36.48,-69.07 36.48,-71.14 36.48,-220.92 -36.49,-293.89 -36.49,-71.14 -36.49,-69.06 -39.42,-66.13 -43.58,-66.13 -46.52,-69.06 -46.52,-71.14
9 Top Assy:
  lines w0.5: -57.5,-55.91 -15,-55.91 ; -49.5,-311 -49.5,-79.97 ; -45.5,-311 -45.5,-79.97 ; -39.5,-311 -57.5,-311 -57.5,-79.97 -11.03,-79.97 ; -37.38,-313.12 47.62,-228.12 ; -8.25,-8.25 0,0 ; -8.25,8.25 0,0 ; 8.25,-8.25 0,0 ; 8.25,8.25 0,0 ; 15,-55.91 57.5,-55.91 ; 45.5,-226 45.5,-79.97 ; 45.5,-221 57.5,-221 57.5,-79.97 11.02,-79.97 ; 49.5,-221 49.5,-79.97 ; -49.5,-79.97 -52.17,-78.94 -54.83,-77.97 -57.5,-77.14 -57.5,-50.25 -15,-50.25 -15,-67.93 ; -49.5,-79.97 -52.17,-76.86 -54.83,-73.97 -57.5,-71.49 -14.13,-71.49 ; -15,-67.93 -15,-73.59 -14.77,-75.45 -14.13,-77.14 ; -15,-67.93 -14.77,-69.8 -14.13,-71.49 ; -14.13,-77.14 -14.13,-71.49 ; -14.13,-77.14 -13.3,-78.07 -12.25,-79.05 -11.03,-79.97 ; -14.13,-71.49 -13.39,-73.98 -12.37,-76.89 -11.03,-79.97 ; -11.02,-79.97 ccw(c0,-69.8) 11.02,-79.97 ; 11.02,-79.97 12.25,-79.05 13.3,-78.07 14.13,-77.14 ; 11.02,-79.97 12.37,-76.89 13.39,-73.98 14.13,-71.49 ; 14.13,-77.14 14.77,-75.45 15,-73.59 15,-67.93 ; 14.13,-77.14 14.13,-71.49 ; 14.13,-71.49 57.5,-71.49 54.83,-73.97 52.17,-76.86 49.5,-79.97 ; 14.13,-71.49 14.77,-69.8 15,-67.93 ; 15,-67.93 15,-50.25 57.5,-50.25 57.5,-77.14 54.83,-77.97 52.17,-78.94 49.5,-79.97 ; -40.21,-310.29 -31.72,-318.78 53.28,-233.78 44.79,-225.29 -40.21,-310.29
  text ".Designator" at -19.09,-89.8 h60
13 Top 3D Bodies:
  lines w10: -41.5,-71.14 -41.5,-306 41.5,-223 41.5,-71.14 ; -13.89,-71.14 -92.5,-71.14 -92.5,-318.78 ccw(c-67.5,-318.78) -67.5,-343.78 -16.78,-343.78 92.5,-234.5 92.5,-71.14 13.89,-71.14
3D body "35860A.stp": height 37.5, standoff 0.5, extent -57.5,-318.78 57.5,-50.25

## 35861 [mil] "SHIELD,HYDRA,A1-J1"
height 37
Top Solder:
  pour cut-out: -46.51,71.14 -46.51,259 -46.51,260 -45.75,261.84 -44.34,263.25 -42.5,264.01 -41.5,264.01 41.5,264.01 42.5,264.01 44.34,263.25 45.75,261.84 46.51,260 46.51,259 46.51,71.14 46.51,69.06 43.58,66.13 39.42,66.13 36.48,69.06 36.48,71.14 36.48,253.98 -36.48,253.98 -36.48,71.14 -36.48,69.06 -39.42,66.13 -43.58,66.13 -46.51,69.06
  pour cut-out: -92.5,66.13 -13.89,66.13 -12.89,66.13 -11.05,66.89 -9.64,68.3 -8.88,70.14 -8.88,71.14 -8.88,72.14 -9.64,73.98 -11.05,75.39 -12.89,76.16 -13.89,76.16 -87.48,76.16 -87.48,285 -87.1,288.9 -84.12,296.1 -78.6,301.62 -71.4,304.6 -67.5,304.99 67.5,304.99 67.51,304.99 67.52,304.99 67.53,304.99 67.54,304.99 67.55,304.99 71.44,304.59 78.62,301.61 84.12,296.1 87.1,288.92 87.48,285.03 87.48,285.02 87.48,285.01 87.48,285 87.48,285.01 87.48,285.02 87.48,285.03 87.48,285 87.48,76.16 13.89,76.16 11.81,76.16 8.88,73.22 8.88,69.06 11.81,66.13 13.89,66.13 92.5,66.13 93.5,66.13 95.34,66.89 96.75,68.3 97.52,70.14 97.52,71.14 97.51,284.97 97.51,284.98 97.51,284.99 97.52,285 97.52,287.96 96.36,293.76 94.1,299.22 90.81,304.13 86.63,308.31 81.72,311.6 76.25,313.86 70.46,315.02 67.5,315.02 67.49,315.02 67.48,315.02 67.47,315.02 67.45,315.01 -67.5,315.01 -70.46,315.01 -76.25,313.86 -81.72,311.6 -86.63,308.31 -90.81,304.13 -94.1,299.22 -96.36,293.75 -97.51,287.96 -97.51,285 -97.51,71.14 -97.51,70.14 -96.75,68.3 -95.34,66.89 -93.5,66.13
9 Top Assy:
  lines w0.5: -9.22,3.35 0,0 ; -3.35,-9.22 0,0 ; 3.35,9.22 0,0 ; 9.22,-3.35 0,0
  lines w2: -57.5,55.91 -15,55.91 ; -49.5,79.97 -49.5,267 -49.23,265.67 -48.45,264.33 -47.27,263 ; -45.5,79.97 -45.5,263 ; 15,55.91 57.5,55.91 ; 45.5,79.97 45.5,263 ; 47.27,263 48.45,264.33 49.23,265.67 49.5,267 49.5,79.97 ; -57.5,267 57.5,267 ; -57.5,267 -56.68,265.67 -54.35,264.33 -50.81,263 50.81,263 54.35,264.33 56.68,265.67 57.5,267 ; -57.5,267 -54.5,266.46 -51.5,265 -49.5,263.67 -48.5,263 -51.5,269 -54.5,273.39 -57.5,275 ; -57.5,275 57.5,275 ; -57.5,275 -57.5,79.97 -11.03,79.97 ; -15,67.93 -15,73.59 -14.77,75.45 -14.13,77.14 ; -15,67.93 -15,50.25 -57.5,50.25 -57.5,77.14 -54.5,77.97 -51.5,78.94 -48.5,79.97 -51.5,76.86 -54.5,73.97 -57.5,71.49 -14.13,71.49 ; -15,67.93 -14.77,69.8 -14.13,71.49 ; -14.13,71.49 -14.13,77.14 ; -14.13,71.49 -13.39,73.98 -12.37,76.89 -11.03,79.97 ; -14.13,77.14 -13.3,78.07 -12.25,79.05 -11.03,79.97 ; -11.02,79.97 cw(c0,69.8) 11.02,79.97 ; 11.02,79.97 12.25,79.05 13.3,78.07 14.13,77.14 ; 11.02,79.97 12.37,76.89 13.39,73.98 14.13,71.49 ; 11.02,79.97 57.5,79.97 57.5,275 ; 14.13,71.49 14.77,69.8 15,67.93 ; 14.13,71.49 14.13,77.14 ; 14.13,71.49 57.5,71.49 54.5,73.97 51.5,76.86 48.5,79.97 49.39,79.66 51.5,78.94 54.5,77.97 57.5,77.14 57.5,50.25 15,50.25 15,67.93 ; 14.13,77.14 14.77,75.45 15,73.59 15,67.93 ; 57.5,267 54.5,266.46 51.5,265 49.5,263.67 48.5,263 51.5,269 54.5,273.39 57.5,275
  text ".Designator" at -17.53,250.08 h60
13 Top 3D Bodies:
  lines w10: -41.5,71.14 -41.5,259 41.5,259 41.5,71.14 ; -13.89,71.14 -92.5,71.14 -92.5,285 cw(c-67.5,285) -67.5,310 67.5,310 cw(c67.5,285) 92.5,285 92.5,71.14 13.89,71.14
3D body "35861A.stp": height 37.5, standoff 0.5, extent -57.51,50.25 57.5,275

## 35963 [mil] "PCA, HYDRA A1-A2 SW CTRL LOGIC"
height 47.24
9 Top Assy:
  drawing of 325 lines, arcs and shapes, not listed
  text ".Designator" at 200,100 h50
3D body "35963A_2016-03-18.step": height 47.24, standoff -16.2, extent -57,-45 407,443